# Altium footprint library THU.PcbLib: 477 footprints (part 20 of 30)
Each footprint in its own frame and in the unit in brackets; x right, y up, seen from the top. Pads: shape width x height; smd on the part's side, far side on the other; paste and mask are expansions set on the pad; w line width, h text height; cw(c..) or ccw(c..) is an arc to the next point about the centre after c.
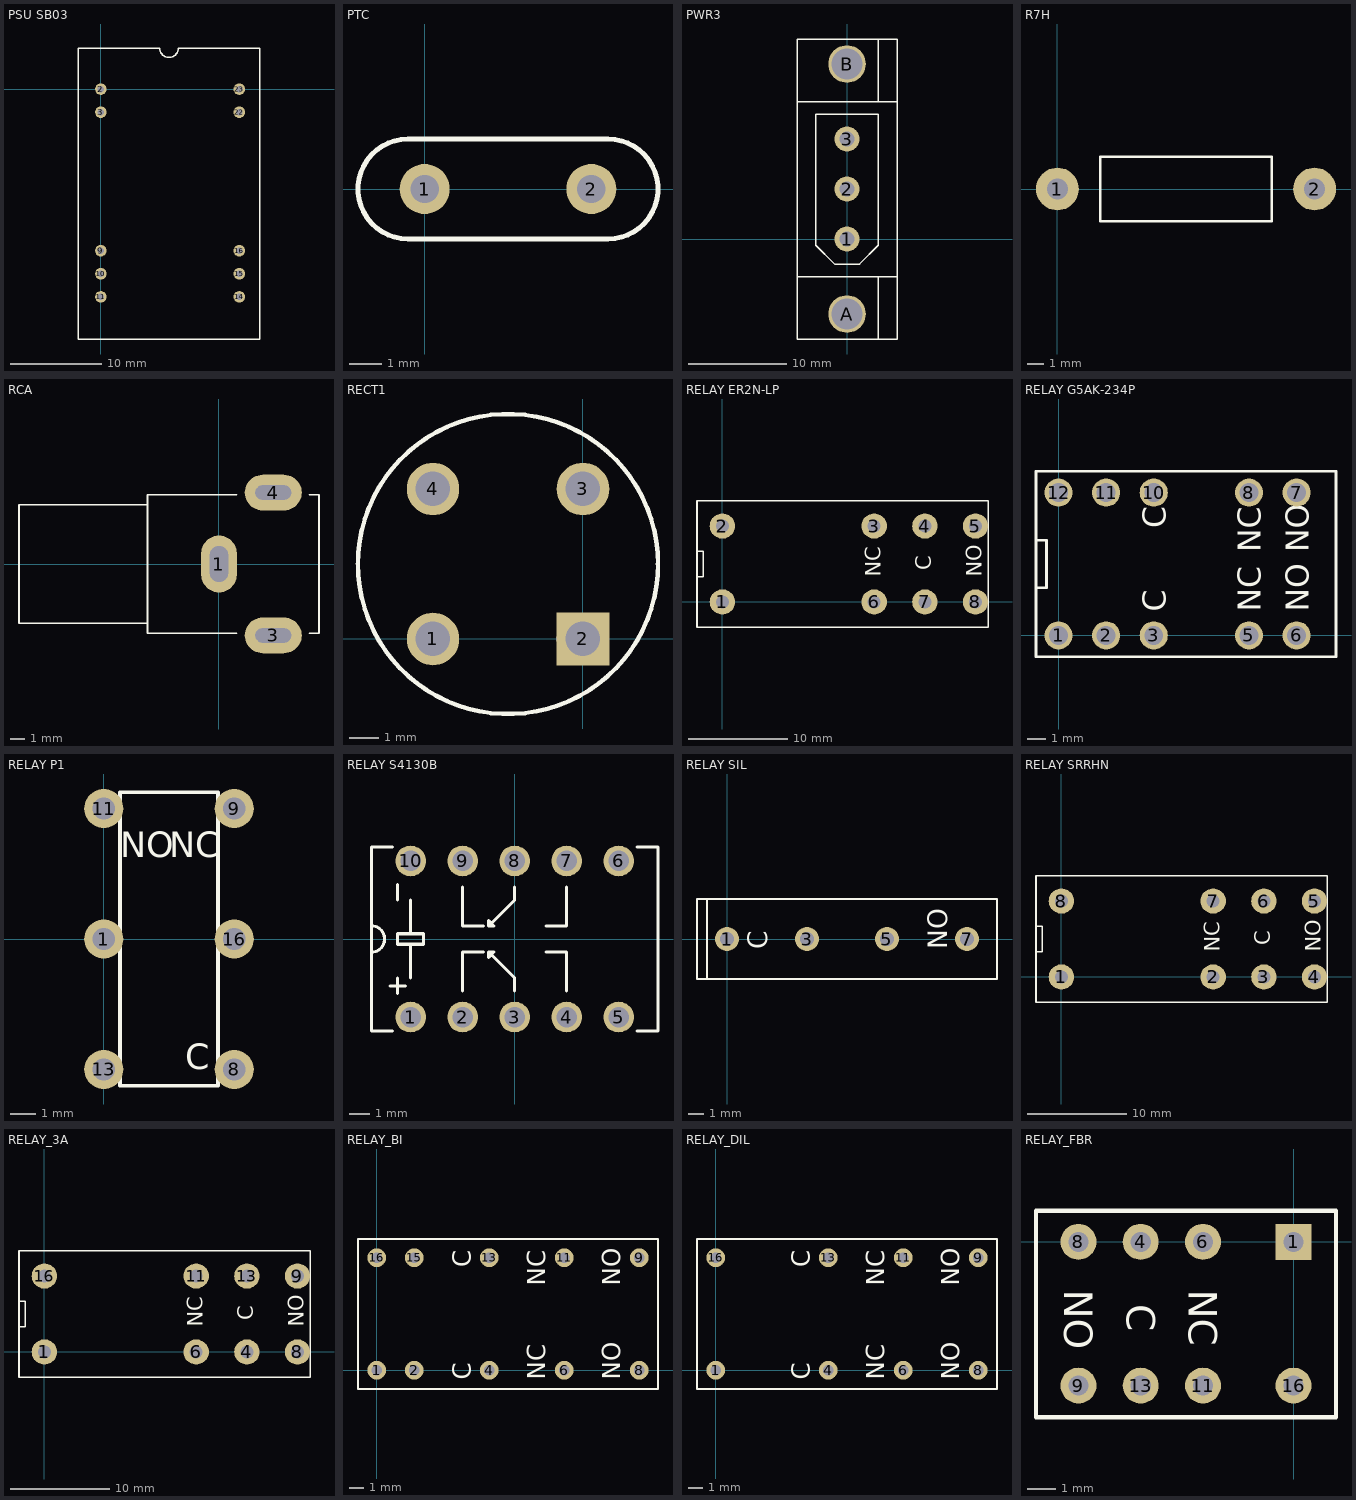
[diagram p19: the footprints below, top view; thin cyan lines are the x and y axes]

## PSU SB03 [mil]
pads (10):
  round 50 hole 28: 2(0,0) 3(0,-100) 9(0,-700) 10(0,-800) 11(0,-900) 14(600,-900) 15(600,-800) 16(600,-700) 22(600,-100) 23(600,0)
TopOverlay:
  lines w6: 255.28,177.16 ccw(c295.28,177.16) 335.28,177.16 ; 255.91,177.16 -98.42,177.16 -98.42,-1082.68 688.98,-1082.68 688.98,177.16 334.65,177.16

## PTC [mil]
pads (2):
  round 60 hole 34: 1(0,0) 2(200,0)
TopOverlay:
  lines w6: -20,-60 cw(c-20,0) -20,60 220,60 cw(c220,0) 220,-60 -20,-60

## PWR3 [mil]
pads (5):
  round 100 hole 59: 1(0,0) 2(0,200) 3(0,400)
  round 150 hole 125: A(0,-300) B(0,700)
TopOverlay:
  lines w6: -200,-150 200,-150 ; -200,550 200,550 ; 125,-400 125,-150 ; 125,550 125,800 ; -200,-400 -200,800 200,800 200,-400 -200,-400 ; -125,-25 -125,500 125,500 125,-25 50,-100 -50,-100 -125,-25

## R7H [mil]
pads (2):
  round 100 hole 49: 1(0,0) 2(600,0)
TopOverlay:
  lines w6: 100,-75 100,75 500,75 500,-75 100,-75

## RCA [mm] "PSG01545/PSG01547"
height 13.8
pads (3):
  oval 2.5x4 hole 1.3 slot 2.5 at 90 deg: 1(0,0)
  oval 4x2.5 hole 1 slot 2.5 at 0 deg: 3(3.8,-5) 4(3.8,5)
TopOverlay:
  lines w0.127: -5,-4.15 -14,-4.15 -14,0 -14,4.15 -5,4.15 ; 1.216,-4.85 -5,-4.85 -5,0 -5,4.85 1.216,4.85 ; 6.344,-4.85 7,-4.85 7,0 7,4.85 6.344,4.85
3D body: height 12.35, standoff 4.05, extent -14.08,-4.109 -5.08,4.191
3D body: height 13.8, standoff 2.8, extent -5.08,-4.826 6.985,4.826

## RECT1 [mil]
pads (4):
  round 70 hole 46: 1(-200,0) 3(0,200) 4(-200,200)
  rect 70x70 hole 46: 2(0,0)
TopOverlay:
  circle w6: c-100,100 r200
  text "+" at 25,25 h60

## RELAY ER2N-LP [mm] "IMO RELAY"
height 0.399
pads (8):
  round 2.54 hole 1.3: 1(0,0) 2(0,7.62) 3(15.24,7.62) 4(20.32,7.62) 5(25.4,7.62) 6(15.24,0) 7(20.32,0) 8(25.4,0)
TopOverlay:
  lines w0.152: -2.54,2.54 -1.905,2.54 -1.905,5.08 -2.54,5.08 ; -2.54,-2.54 26.67,-2.54 26.67,10.16 -2.54,10.16 -2.54,-2.54
  text "C" at 20.955,3.175 h1.52
  text "NC" at 15.875,2.54 h1.52
  text "NO" at 26.035,2.54 h1.52

## RELAY G5AK-234P [mm]
pads (10):
  round 1.5 hole 1: 1(0,0) 2(2.54,0) 3(5.08,0) 5(10.16,0) 6(12.7,0) 7(12.7,7.62) 8(10.16,7.62) 10(5.08,7.62) 11(2.54,7.62) 12(0,7.62)
TopOverlay:
  lines w0.152: -1.2,2.54 -0.635,2.54 -0.635,5.08 -1.2,5.08 ; -1.2,-1.14 14.8,-1.14 14.8,8.76 -1.2,8.76 -1.2,-1.14
  text "C" at 5.715,5.715 h1.22
  text "NC" at 10.795,4.445 h1.22
  text "NO" at 13.335,4.445 h1.22
  text "NO" at 13.335,1.27 h1.22
  text "C" at 5.715,1.27 h1.22
  text "NC" at 10.795,1.27 h1.22

## RELAY P1 [mil]
pads (6):
  round 60 hole 34: 1(0,0) 8(200,-200) 9(200,200) 11(0,200) 13(0,-200) 16(200,0)
TopOverlay:
  lines w6: 25,-225 25,225 175,225 175,-225 25,-225
  text "NO" at 25,125 h39.37
  text "NC" at 100,125 h39.37
  text "C" at 125,-200 h39.37

## RELAY S4130B [mm] "ALTRONICS 12V 2A DPDT RELAY P/N S4130B"
height 0.127
pads (10):
  round 1.5 hole 1: 1(-5.08,-3.81) 2(-2.54,-3.81) 3(0,-3.81) 4(2.54,-3.81) 5(5.08,-3.81) 6(5.08,3.81) 7(2.54,3.81) 8(0,3.81) 9(-2.54,3.81) 10(-5.08,3.81)
TopOverlay:
  lines w0.152: -7,-0.65 ccw(c-7,0) -7,0.65 ; -6.096,-2.286 -5.334,-2.286 ; -5.969,-4.5 -7,-4.5 -7,4.5 -5.969,4.5 ; -5.715,-2.667 -5.715,-1.905 ; -5.715,1.905 -5.715,2.667 ; -5.08,-1.905 -5.08,-0.254 ; -5.08,0.254 -5.08,1.905 ; -2.54,-2.54 -2.54,-0.635 -1.524,-0.635 ; -2.54,2.54 -2.54,0.635 -1.524,0.635 ; 0,-2.54 0,-1.905 -1.27,-0.635 ; 0,2.54 0,1.905 -1.27,0.635 ; 1.524,-0.635 2.54,-0.635 2.54,-2.54 ; 1.524,0.635 2.54,0.635 2.54,2.54 ; 5.969,-4.5 7,-4.5 7,4.5 5.969,4.5 ; -1.27,-0.635 -1.016,-0.635 -1.27,-0.889 -1.27,-0.635 ; -1.27,0.635 -1.27,0.889 -1.016,0.635 -1.27,0.635 ; -5.715,-0.254 -4.445,-0.254 -4.445,0.254 -5.715,0.254 -5.715,-0.254

## RELAY SIL [mil]
pads (4):
  round 60 hole 34: 1(0,0) 3(200,0) 5(400,0) 7(600,0)
TopOverlay:
  lines w6: -50,-100 -50,100 ; -75,-100 675,-100 675,100 -75,100 -75,-100
  text "C" at 100,-25 h48
  text "NO" at 550,-25 h48

## RELAY SRRHN [mm]
pads (8):
  round 2.54 hole 1.3: 1(0,0) 2(15.24,0) 3(20.32,0) 4(25.4,0) 5(25.4,7.62) 6(20.32,7.62) 7(15.24,7.62) 8(0,7.62)
TopOverlay:
  lines w0.152: -2.54,2.54 -1.905,2.54 -1.905,5.08 -2.54,5.08 ; -2.54,-2.54 -2.54,10.16 26.67,10.16 26.67,-2.54 -2.54,-2.54
  text "NO" at 26.035,2.54 h1.52
  text "NC" at 15.875,2.54 h1.52
  text "C" at 20.955,3.175 h1.52

## RELAY_3A [mm]
pads (8):
  round 2.54 hole 1.3: 1(0,0) 4(20.32,0) 6(15.24,0) 8(25.4,0) 9(25.4,7.62) 11(15.24,7.62) 13(20.32,7.62) 16(0,7.62)
TopOverlay:
  lines w0.152: -2.54,2.54 -1.905,2.54 -1.905,5.08 -2.54,5.08 ; -2.54,-2.54 26.67,-2.54 26.67,10.16 -2.54,10.16 -2.54,-2.54
  text "C" at 20.955,3.175 h1.52
  text "NC" at 15.875,2.54 h1.52
  text "NO" at 26.035,2.54 h1.52

## RELAY_BI [mil]
pads (10):
  round 50 hole 28: 1(0,0) 2(100,0) 4(300,0) 6(500,0) 8(700,0) 9(700,300) 11(500,300) 13(300,300) 15(100,300) 16(0,300)
TopOverlay:
  lines w6: -50,-50 750,-50 750,350 -50,350 -50,-50
  text "C" at 250,275 h48
  text "NC" at 450,225 h48
  text "NO" at 650,225 h48
  text "NO" at 650,-25 h48
  text "NC" at 450,-25 h48
  text "C" at 250,-25 h48

## RELAY_DIL [mil]
pads (8):
  round 50 hole 28: 1(0,0) 4(300,0) 6(500,0) 8(700,0) 9(700,300) 11(500,300) 13(300,300) 16(0,300)
TopOverlay:
  lines w6: -50,-50 -50,350 750,350 750,-50 -50,-50
  text "C" at 250,-25 h48
  text "NC" at 450,-25 h48
  text "NO" at 650,-25 h48
  text "NO" at 650,225 h48
  text "NC" at 450,225 h48
  text "C" at 250,275 h48

## RELAY_FBR [mil]
pads (8):
  rect 50x50 hole 28: 1(0,0)
  round 50 hole 28: 4(-212.6,0) 6(-125.98,0) 8(-299.21,0) 9(-299.21,-200) 11(-125.98,-200) 13(-212.6,-200) 16(0,-200)
TopOverlay:
  lines w6: -358.27,-244.09 59.05,-244.09 59.05,43.31 -358.27,43.31 -358.27,-244.09
  text "NO" at -318.9,-66.93 h39.37
  text "NC" at -145.67,-66.93 h39.37
  text "C" at -232.28,-86.61 h39.37